# Altium footprint library Connectors.PcbLib: 135 footprints (part 1 of 9)
Each footprint in its own frame and in the unit in brackets; x right, y up, seen from the top. Pads: shape width x height; smd on the part's side, far side on the other; paste and mask are expansions set on the pad; w line width, h text height; cw(c..) or ccw(c..) is an arc to the next point about the centre after c.
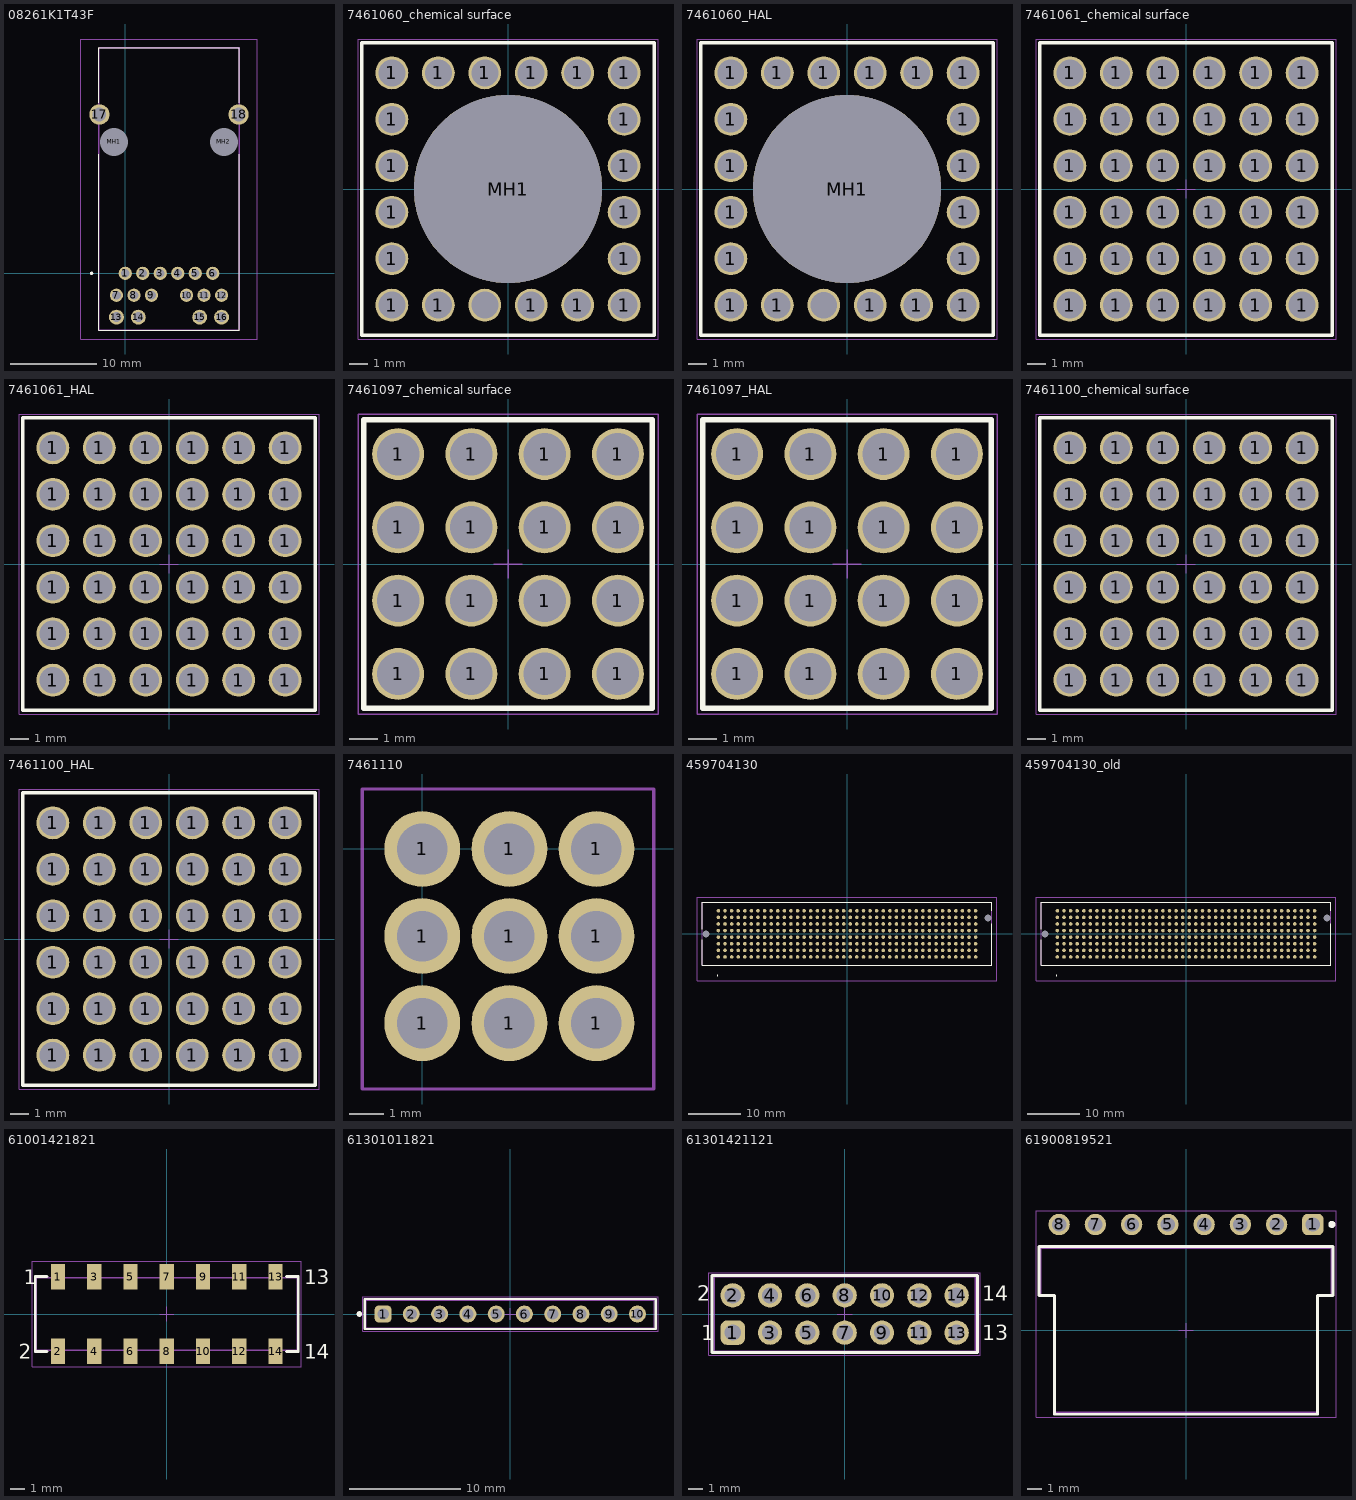
[diagram p0: the footprints below, top view; thin cyan lines are the x and y axes]

## 08261K1T43F [mm]
pads (20):
  round 1.53 hole 1.02: 1(0,0) 2(2.03,0) 3(4.06,0) 4(6.09,0) 5(8.12,0) 6(10.15,0) 7(-1.015,-2.54) 8(1.015,-2.54) 9(3.045,-2.54) 10(7.105,-2.54) 11(9.135,-2.54) 12(11.165,-2.54)
  round 1.725 hole 1.15: 13(-1.02,-5.08) 14(1.52,-5.08) 15(8.63,-5.08) 16(11.17,-5.08)
  round 2.355 hole 1.57: 17(-2.99,18.41) 18(13.14,18.41)
  round 1.625 hole 3.25 unplated: MH1(-1.275,15.24) MH2(11.425,15.24)
Top Overlay:
  lines w0.1: -3.08,13.78 -3.08,-6.61 13.075,-6.61 13.23,-6.61 13.23,13.78 ; -3.08,19.78 -3.08,26.16 13.23,26.16 13.23,19.78
  lines w0.2: -3.9,-0.1 ccw(c-3.9,0) -3.9,0.1 ccw(c-3.9,0) -3.9,-0.1
Top Component Outline:
  lines w0.2: -3.08,-6.61 13.23,-6.61 13.23,26.16 -3.08,26.16 -3.08,-6.61
Top Courtyard (Mech26):
  lines w0.1: -5.168,-7.61 15.317,-7.61 15.317,27.16 -5.168,27.16 -5.168,-7.61
3D body "0826-1K1T-43-F.stp": height 13.71, standoff -5, extent -3.675,-6.61 13.825,26.16

## 7461060_chemical surface [mm] "M10, thr 17.5mm"
height 17.5
pads (21):
  round 1.8 hole 1.475: 1(-6.35,-6.35) 1(-6.35,-3.81) 1(-6.35,-1.27) 1(-6.35,1.27) 1(-6.35,3.81) 1(-6.35,6.35) 1(-3.81,-6.35) 1(-3.81,6.35) 1(-1.27,6.35) 1(1.27,-6.35) 1(1.27,6.35) 1(3.81,-6.35) 1(3.81,6.35) 1(6.35,-6.35) 1(6.35,-3.81) 1(6.35,-1.27) 1(6.35,1.27) 1(6.35,3.81) 1(6.35,6.35) ""(-1.27,-6.35)
  round 10.3 hole 10.3 unplated: MH1(0,0)
Top Overlay:
  lines w0.2: -8,-8 8,-8 8,8 -8,8 -8,-8
Top 3D Body (Mech20):
  lines w0.1: -8,-8 8,-8 8,8 -8,8 -8,-8
Top Component Outline:
  lines w0.1: -8,-8 -8,8 8,8 8,-8 -8,-8
Top Courtyard (Mech26):
  lines w0.05: -0.5,0 0.5,0 ; 0,-0.5 0,0.5 ; -8.2,-8.2 -8.2,8.2 8.2,8.2 8.2,-8.2 -8.2,-8.2
Top Designator:
  text ".Designator" at -7.498,-0.5 h1.5
3D body "7461060.stp": height 17.5, standoff -3.5, extent -8,-8 8,8

## 7461060_HAL [mm] "M10, thr 17.5mm"
height 17.5
pads (21):
  round 1.8 hole 1.45: 1(-6.35,-6.35) 1(-6.35,-3.81) 1(-6.35,-1.27) 1(-6.35,1.27) 1(-6.35,3.81) 1(-6.35,6.35) 1(-3.81,-6.35) 1(-3.81,6.35) 1(-1.27,6.35) 1(1.27,-6.35) 1(1.27,6.35) 1(3.81,-6.35) 1(3.81,6.35) 1(6.35,-6.35) 1(6.35,-3.81) 1(6.35,-1.27) 1(6.35,1.27) 1(6.35,3.81) 1(6.35,6.35) ""(-1.27,-6.35)
  round 10.3 hole 10.3 unplated: MH1(0,0)
Top Overlay:
  lines w0.2: -8,-8 8,-8 8,8 -8,8 -8,-8
Top 3D Body (Mech20):
  lines w0.1: -8,-8 -8,8 8,8 8,-8 -8,-8
Top Component Outline:
  lines w0.1: -8,-8 8,-8 8,8 -8,8 -8,-8
Top Courtyard (Mech26):
  lines w0.05: -0.5,0 0.5,0 ; 0,-0.5 0,0.5 ; -8.2,-8.2 -8.2,8.2 8.2,8.2 8.2,-8.2 -8.2,-8.2
Top Designator:
  text ".Designator" at -7.498,-0.5 h1.5
3D body "7461060.stp": height 17.5, standoff -3.5, extent -8,-8 8,8

## 7461061_chemical surface [mm] "M10, blind 11mm"
height 17.5
pads (36):
  round 1.8 hole 1.475: 1(-6.35,-6.35) 1(-6.35,-3.81) 1(-6.35,-1.27) 1(-6.35,1.27) 1(-6.35,3.81) 1(-6.35,6.35) 1(-3.81,-6.35) 1(-3.81,-3.81) 1(-3.81,-1.27) 1(-3.81,1.27) 1(-3.81,3.81) 1(-3.81,6.35) 1(-1.27,-6.35) 1(-1.27,-3.81) 1(-1.27,-1.27) 1(-1.27,1.27) 1(-1.27,3.81) 1(-1.27,6.35) 1(1.27,-6.35) 1(1.27,-3.81) 1(1.27,-1.27) 1(1.27,1.27) 1(1.27,3.81) 1(1.27,6.35) 1(3.81,-6.35) 1(3.81,-3.81) 1(3.81,-1.27) 1(3.81,1.27) 1(3.81,3.81) 1(3.81,6.35) 1(6.35,-6.35) 1(6.35,-3.81) 1(6.35,-1.27) 1(6.35,1.27) 1(6.35,3.81) 1(6.35,6.35)
Top Overlay:
  lines w0.2: -8,-8 -8,8 8,8 8,-8 -8,-8
Top 3D Body (Mech20):
  lines w0.1: -8,-8 -8,8 8,8 8,-8 -8,-8
Top Component Outline:
  lines w0.1: -8,-8 8,-8 8,8 -8,8 -8,-8
Top Courtyard (Mech26):
  lines w0.05: -0.5,0 0.5,0 ; 0,-0.5 0,0.5 ; -8.2,-8.2 -8.2,8.2 8.2,8.2 8.2,-8.2 -8.2,-8.2
Top Designator:
  text ".Designator" at -7.498,-0.5 h1.5
3D body "7461061.stp": height 17.5, standoff -3.5, extent -8,-8 8,8

## 7461061_HAL [mm] "M10, blind 11mm"
height 17.5
pads (36):
  round 1.8 hole 1.45: 1(-6.35,-6.35) 1(-6.35,-3.81) 1(-6.35,-1.27) 1(-6.35,1.27) 1(-6.35,3.81) 1(-6.35,6.35) 1(-3.81,-6.35) 1(-3.81,-3.81) 1(-3.81,-1.27) 1(-3.81,1.27) 1(-3.81,3.81) 1(-3.81,6.35) 1(-1.27,-6.35) 1(-1.27,-3.81) 1(-1.27,-1.27) 1(-1.27,1.27) 1(-1.27,3.81) 1(-1.27,6.35) 1(1.27,-6.35) 1(1.27,-3.81) 1(1.27,-1.27) 1(1.27,1.27) 1(1.27,3.81) 1(1.27,6.35) 1(3.81,-6.35) 1(3.81,-3.81) 1(3.81,-1.27) 1(3.81,1.27) 1(3.81,3.81) 1(3.81,6.35) 1(6.35,-6.35) 1(6.35,-3.81) 1(6.35,-1.27) 1(6.35,1.27) 1(6.35,3.81) 1(6.35,6.35)
Top Overlay:
  lines w0.2: -8,-8 8,-8 8,8 -8,8 -8,-8
Top 3D Body (Mech20):
  lines w0.1: -8,-8 -8,8 8,8 8,-8 -8,-8
Top Component Outline:
  lines w0.1: -8,-8 8,-8 8,8 -8,8 -8,-8
Top Courtyard (Mech26):
  lines w0.05: -0.5,0 0.5,0 ; 0,-0.5 0,0.5 ; -8.2,-8.2 8.2,-8.2 8.2,8.2 -8.2,8.2 -8.2,-8.2
Top Designator:
  text ".Designator" at -7.498,-0.5 h1.5
3D body "7461061.stp": height 17.5, standoff -3.5, extent -8,-8 8,8

## 7461097_chemical surface [mm] "M6, blind 6.5mm"
height 10.5
pads (16):
  round 1.8 hole 1.475: 1(-3.81,-3.81) 1(-3.81,-1.27) 1(-3.81,1.27) 1(-3.81,3.81) 1(-1.27,-3.81) 1(-1.27,-1.27) 1(-1.27,1.27) 1(-1.27,3.81) 1(1.27,-3.81) 1(1.27,-1.27) 1(1.27,1.27) 1(1.27,3.81) 1(3.81,-3.81) 1(3.81,-1.27) 1(3.81,1.27) 1(3.81,3.81)
Top Overlay:
  lines w0.2: -5,-5 5,-5 5,5 -5,5 -5,-5
Top 3D Body (Mech20):
  lines w0.1: -5,-5 5,-5 5,5 -5,5 -5,-5
Top Component Outline:
  lines w0.1: -5,-5 -5,5 5,5 5,-5 -5,-5
Top Courtyard (Mech26):
  lines w0.05: -0.5,0 0.5,0 ; 0,-0.5 0,0.5 ; -5.2,-5.2 -5.2,5.2 5.2,5.2 5.2,-5.2 -5.2,-5.2
Top Designator:
  text ".Designator" at -7.498,-0.5 h1.5
3D body "7461097.stp": height 10.5, standoff -3.5, extent -5,-5 5,5

## 7461097_HAL [mm] "M6, blind 6.5mm"
height 10.5
pads (16):
  round 1.8 hole 1.45: 1(-3.81,-3.81) 1(-3.81,-1.27) 1(-3.81,1.27) 1(-3.81,3.81) 1(-1.27,-3.81) 1(-1.27,-1.27) 1(-1.27,1.27) 1(-1.27,3.81) 1(1.27,-3.81) 1(1.27,-1.27) 1(1.27,1.27) 1(1.27,3.81) 1(3.81,-3.81) 1(3.81,-1.27) 1(3.81,1.27) 1(3.81,3.81)
Top Overlay:
  lines w0.2: -5,-5 -5,5 5,5 5,-5 -5,-5
Top 3D Body (Mech20):
  lines w0.1: -5,-5 5,-5 5,5 -5,5 -5,-5
Top Component Outline:
  lines w0.1: -5,-5 5,-5 5,5 -5,5 -5,-5
Top Courtyard (Mech26):
  lines w0.05: -0.5,0 0.5,0 ; 0,-0.5 0,0.5 ; -5.2,-5.2 5.2,-5.2 5.2,5.2 -5.2,5.2 -5.2,-5.2
Top Designator:
  text ".Designator" at -7.498,-0.5 h1.5
3D body "7461097.stp": height 10.5, standoff -3.5, extent -5,-5 5,5

## 7461100_chemical surface [mm] "M10, thread 16mm"
height 24
pads (36):
  round 1.8 hole 1.475: 1(-6.35,-6.35) 1(-6.35,-3.81) 1(-6.35,-1.27) 1(-6.35,1.27) 1(-6.35,3.81) 1(-6.35,6.35) 1(-3.81,-6.35) 1(-3.81,-3.81) 1(-3.81,-1.27) 1(-3.81,1.27) 1(-3.81,3.81) 1(-3.81,6.35) 1(-1.27,-6.35) 1(-1.27,-3.81) 1(-1.27,-1.27) 1(-1.27,1.27) 1(-1.27,3.81) 1(-1.27,6.35) 1(1.27,-6.35) 1(1.27,-3.81) 1(1.27,-1.27) 1(1.27,1.27) 1(1.27,3.81) 1(1.27,6.35) 1(3.81,-6.35) 1(3.81,-3.81) 1(3.81,-1.27) 1(3.81,1.27) 1(3.81,3.81) 1(3.81,6.35) 1(6.35,-6.35) 1(6.35,-3.81) 1(6.35,-1.27) 1(6.35,1.27) 1(6.35,3.81) 1(6.35,6.35)
Top Overlay:
  lines w0.2: -8,-8 -8,8 8,8 8,-8 -8,-8
Top 3D Body (Mech20):
  lines w0.1: -8,-8 -8,8 8,8 8,-8 -8,-8
Top Component Outline:
  lines w0.1: -8,-8 8,-8 8,8 -8,8 -8,-8
Top Courtyard (Mech26):
  lines w0.05: -0.5,0 0.5,0 ; 0,-0.5 0,0.5 ; -8.2,-8.2 -8.2,8.2 8.2,8.2 8.2,-8.2 -8.2,-8.2
Top Designator:
  text ".Designator" at -7.498,-0.5 h1.5
3D body "7461100.stp": height 24, standoff -3.5, extent -8,-8 8,8

## 7461100_HAL [mm] "M10, thread 16mm"
height 24
pads (36):
  round 1.8 hole 1.45: 1(-6.35,-6.35) 1(-6.35,-3.81) 1(-6.35,-1.27) 1(-6.35,1.27) 1(-6.35,3.81) 1(-6.35,6.35) 1(-3.81,-6.35) 1(-3.81,-3.81) 1(-3.81,-1.27) 1(-3.81,1.27) 1(-3.81,3.81) 1(-3.81,6.35) 1(-1.27,-6.35) 1(-1.27,-3.81) 1(-1.27,-1.27) 1(-1.27,1.27) 1(-1.27,3.81) 1(-1.27,6.35) 1(1.27,-6.35) 1(1.27,-3.81) 1(1.27,-1.27) 1(1.27,1.27) 1(1.27,3.81) 1(1.27,6.35) 1(3.81,-6.35) 1(3.81,-3.81) 1(3.81,-1.27) 1(3.81,1.27) 1(3.81,3.81) 1(3.81,6.35) 1(6.35,-6.35) 1(6.35,-3.81) 1(6.35,-1.27) 1(6.35,1.27) 1(6.35,3.81) 1(6.35,6.35)
Top Overlay:
  lines w0.2: -8,-8 -8,8 8,8 8,-8 -8,-8
Top 3D Body (Mech20):
  lines w0.1: -8,-8 8,-8 8,8 -8,8 -8,-8
Top Component Outline:
  lines w0.1: -8,-8 -8,8 8,8 8,-8 -8,-8
Top Courtyard (Mech26):
  lines w0.05: -0.5,0 0.5,0 ; 0,-0.5 0,0.5 ; -8.2,-8.2 -8.2,8.2 8.2,8.2 8.2,-8.2 -8.2,-8.2
Top Designator:
  text ".Designator" at -7.498,-0.5 h1.5
3D body "7461100.stp": height 24, standoff -3.5, extent -8,-8 8,8

## 7461110 [mm]
pads (9):
  round 2.213 hole 1.475: 1(0,-5.08) 1(0,-2.54) 1(0,0) 1(2.54,-5.08) 1(2.54,-2.54) 1(2.54,0) 1(5.08,-5.08) 1(5.08,-2.54) 1(5.08,0)
Top Courtyard (Mech26):
  lines w0.1: -1.75,-7 6.75,-7 6.75,1.75 -1.75,1.75 -1.75,-7
3D body "7461110 (rev1).stp": height 14, standoff -3.5, extent -0.96,-6.04 6.04,0.96

## 459704130 [mil]
pads (322):
  round 27.01 smd: 1(-975,-175) 2(-975,-125) 3(-975,-75) 4(-975,-25) 5(-975,25) 6(-975,75) 7(-975,125) 8(-975,175) 9(-925,-175) 10(-925,-125) 11(-925,-75) 12(-925,-25) 13(-925,25) 14(-925,75) 15(-925,125) 16(-925,175) 17(-875,-175) 18(-875,-125) 19(-875,-75) 20(-875,-25) 21(-875,25) 22(-875,75) 23(-875,125) 24(-875,175) 25(-825,-175) 26(-825,-125) 27(-825,-75) 28(-825,-25) 29(-825,25) 30(-825,75) 31(-825,125) 32(-825,175) 33(-775,-175) 34(-775,-125) 35(-775,-75) 36(-775,-25) 37(-775,25) 38(-775,75) 39(-775,125) 40(-775,175) 41(-725,-175) 42(-725,-125) 43(-725,-75) 44(-725,-25) 45(-725,25) 46(-725,75) 47(-725,125) 48(-725,175) 49(-675,-175) 50(-675,-125) 51(-675,-75) 52(-675,-25) 53(-675,25) 54(-675,75) 55(-675,125) 56(-675,175) 57(-625,-175) 58(-625,-125) 59(-625,-75) 60(-625,-25) 61(-625,25) 62(-625,75) 63(-625,125) 64(-625,175) 65(-575,-175) 66(-575,-125) 67(-575,-75) 68(-575,-25) 69(-575,25) 70(-575,75) 71(-575,125) 72(-575,175) 73(-525,-175) 74(-525,-125) 75(-525,-75) 76(-525,-25) 77(-525,25) 78(-525,75) 79(-525,125) 80(-525,175) 81(-475,-175) 82(-475,-125) 83(-475,-75) 84(-475,-25) 85(-475,25) 86(-475,75) 87(-475,125) 88(-475,175) 89(-425,-175) 90(-425,-125) 91(-425,-75) 92(-425,-25) 93(-425,25) 94(-425,75) 95(-425,125) 96(-425,175) 97(-375,-175) 98(-375,-125) 99(-375,-75) 100(-375,-25) 101(-375,25) 102(-375,75) 103(-375,125) 104(-375,175) 105(-325,-175) 106(-325,-125) 107(-325,-75) 108(-325,-25) 109(-325,25) 110(-325,75) 111(-325,125) 112(-325,175) 113(-275,-175) 114(-275,-125) 115(-275,-75) 116(-275,-25) 117(-275,25) 118(-275,75) 119(-275,125) 120(-275,175) 121(-225,-175) 122(-225,-125) 123(-225,-75) 124(-225,-25) 125(-225,25) 126(-225,75) 127(-225,125) 128(-225,175) 129(-175,-175) 130(-175,-125) 131(-175,-75) 132(-175,-25) 133(-175,25) 134(-175,75) 135(-175,125) 136(-175,175) 137(-125,-175) 138(-125,-125) 139(-125,-75) 140(-125,-25) 141(-125,25) 142(-125,75) 143(-125,125) 144(-125,175) 145(-75,-175) 146(-75,-125) 147(-75,-75) 148(-75,-25) 149(-75,25) 150(-75,75) 151(-75,125) 152(-75,175) 153(-25,-175) 154(-25,-125) 155(-25,-75) 156(-25,-25) 157(-25,25) 158(-25,75) 159(-25,125) 160(-25,175) 161(25,-175) 162(25,-125) 163(25,-75) 164(25,-25) 165(25,25) 166(25,75) 167(25,125) 168(25,175) 169(75,-175) 170(75,-125) 171(75,-75) 172(75,-25) 173(75,25) 174(75,75) 175(75,125) 176(75,175) 177(125,-175) 178(125,-125) 179(125,-75) 180(125,-25) 181(125,25) 182(125,75) 183(125,125) 184(125,175) 185(175,-175) 186(175,-125) 187(175,-75) 188(175,-25) 189(175,25) 190(175,75) 191(175,125) 192(175,175) 193(225,-175) 194(225,-125) 195(225,-75) 196(225,-25) 197(225,25) 198(225,75) 199(225,125) 200(225,175) 201(275,-175) 202(275,-125) 203(275,-75) 204(275,-25) 205(275,25) 206(275,75) 207(275,125) 208(275,175) 209(325,-175) 210(325,-125) 211(325,-75) 212(325,-25) 213(325,25) 214(325,75) 215(325,125) 216(325,175) 217(375,-175) 218(375,-125) 219(375,-75) 220(375,-25) 221(375,25) 222(375,75) 223(375,125) 224(375,175) 225(425,-175) 226(425,-125) 227(425,-75) 228(425,-25) 229(425,25) 230(425,75) 231(425,125) 232(425,175) 233(475,-175) 234(475,-125) 235(475,-75) 236(475,-25) 237(475,25) 238(475,75) 239(475,125) 240(475,175) 241(525,-175) 242(525,-125) 243(525,-75) 244(525,-25) 245(525,25) 246(525,75) 247(525,125) 248(525,175) 249(575,-175) 250(575,-125) 251(575,-75) 252(575,-25) 253(575,25) 254(575,75) 255(575,125) 256(575,175) 257(625,-175) 258(625,-125) 259(625,-75) 260(625,-25) 261(625,25) 262(625,75) 263(625,125) 264(625,175) 265(675,-175) 266(675,-125) 267(675,-75) 268(675,-25) 269(675,25) 270(675,75) 271(675,125) 272(675,175) 273(725,-175) 274(725,-125) 275(725,-75) 276(725,-25) 277(725,25) 278(725,75) 279(725,125) 280(725,175) 281(775,-175) 282(775,-125) 283(775,-75) 284(775,-25) 285(775,25) 286(775,75) 287(775,125) 288(775,175) 289(825,-175) 290(825,-125) 291(825,-75) 292(825,-25) 293(825,25) 294(825,75) 295(825,125) 296(825,175) 297(875,-175) 298(875,-125) 299(875,-75) 300(875,-25) 301(875,25) 302(875,75) 303(875,125) 304(875,175) 305(925,-175) 306(925,-125) 307(925,-75) 308(925,-25) 309(925,25) 310(925,75) 311(925,125) 312(925,175) 313(975,-175) 314(975,-125) 315(975,-75) 316(975,-25) 317(975,25) 318(975,75) 319(975,125) 320(975,175)
  round 26.5 hole 53 unplated: MH1(-1070.51,0) MH2(1070.51,120)
Top Overlay:
  lines w3.94: -1097.99,-239.02 -1097.99,-43.11 -1097.99,-239.02 ; -1097.99,-239.02 1097.99,-239.02 ; -1097.99,-239.02 1097.99,-239.02 ; -1097.99,239.02 1097.99,239.02 ; -1097.99,239.02 1097.99,239.02 ; -1097.99,239.02 -1097.99,35.63 -1097.99,239.02 ; 1097.99,-239.02 1097.99,75 1097.99,-239.02 ; 1097.99,239.02 1097.99,173.43 1097.99,239.02
  lines w7.87: -984.25,-314.96 ccw(c-982.28,-314.96) -980.32,-314.96 ; -984.25,-314.96 cw(c-982.28,-314.96) -980.32,-314.96 ; -984.25,-314.96 ccw(c-982.28,-314.96) -980.32,-314.96
Top Component Outline:
  lines w7.87: -1097.99,-239.02 -1097.99,239.02 1097.99,239.02 1097.99,-239.02 -1097.99,-239.02
Top Courtyard (Mech26):
  lines w3.94: -1137.36,-356.3 1137.36,-356.3 1137.36,278.39 -1137.36,278.39 -1137.36,-356.3
3D body "45970-4130.stp": height 228.94, standoff -66.93, extent -1097.99,-239.02 1097.99,239.02

## 459704130_old [mil]
pads (322):
  round 27.01 smd: A1(-975,-175) A2(-925,-175) A3(-875,-175) A4(-825,-175) A5(-775,-175) A6(-725,-175) A7(-675,-175) A8(-625,-175) A9(-575,-175) A10(-525,-175) A11(-475,-175) A12(-425,-175) A13(-375,-175) A14(-325,-175) A15(-275,-175) A16(-225,-175) A17(-175,-175) A18(-125,-175) A19(-75,-175) A20(-25,-175) A21(25,-175) A22(75,-175) A23(125,-175) A24(175,-175) A25(225,-175) A26(275,-175) A27(325,-175) A28(375,-175) A29(425,-175) A30(475,-175) A31(525,-175) A32(575,-175) A33(625,-175) A34(675,-175) A35(725,-175) A36(775,-175) A37(825,-175) A38(875,-175) A39(925,-175) A40(975,-175) B1(-975,-125) B2(-925,-125) B3(-875,-125) B4(-825,-125) B5(-775,-125) B6(-725,-125) B7(-675,-125) B8(-625,-125) B9(-575,-125) B10(-525,-125) B11(-475,-125) B12(-425,-125) B13(-375,-125) B14(-325,-125) B15(-275,-125) B16(-225,-125) B17(-175,-125) B18(-125,-125) B19(-75,-125) B20(-25,-125) B21(25,-125) B22(75,-125) B23(125,-125) B24(175,-125) B25(225,-125) B26(275,-125) B27(325,-125) B28(375,-125) B29(425,-125) B30(475,-125) B31(525,-125) B32(575,-125) B33(625,-125) B34(675,-125) B35(725,-125) B36(775,-125) B37(825,-125) B38(875,-125) B39(925,-125) B40(975,-125) C1(-975,-75) C2(-925,-75) C3(-875,-75) C4(-825,-75) C5(-775,-75) C6(-725,-75) C7(-675,-75) C8(-625,-75) C9(-575,-75) C10(-525,-75) C11(-475,-75) C12(-425,-75) C13(-375,-75) C14(-325,-75) C15(-275,-75) C16(-225,-75) C17(-175,-75) C18(-125,-75) C19(-75,-75) C20(-25,-75) C21(25,-75) C22(75,-75) C23(125,-75) C24(175,-75) C25(225,-75) C26(275,-75) C27(325,-75) C28(375,-75) C29(425,-75) C30(475,-75) C31(525,-75) C32(575,-75) C33(625,-75) C34(675,-75) C35(725,-75) C36(775,-75) C37(825,-75) C38(875,-75) C39(925,-75) C40(975,-75) D1(-975,-25) D2(-925,-25) D3(-875,-25) D4(-825,-25) D5(-775,-25) D6(-725,-25) D7(-675,-25) D8(-625,-25) D9(-575,-25) D10(-525,-25) D11(-475,-25) D12(-425,-25) D13(-375,-25) D14(-325,-25) D15(-275,-25) D16(-225,-25) D17(-175,-25) D18(-125,-25) D19(-75,-25) D20(-25,-25) D21(25,-25) D22(75,-25) D23(125,-25) D24(175,-25) D25(225,-25) D26(275,-25) D27(325,-25) D28(375,-25) D29(425,-25) D30(475,-25) D31(525,-25) D32(575,-25) D33(625,-25) D34(675,-25) D35(725,-25) D36(775,-25) D37(825,-25) D38(875,-25) D39(925,-25) D40(975,-25) E1(-975,25) E2(-925,25) E3(-875,25) E4(-825,25) E5(-775,25) E6(-725,25) E7(-675,25) E8(-625,25) E9(-575,25) E10(-525,25) E11(-475,25) E12(-425,25) E13(-375,25) E14(-325,25) E15(-275,25) E16(-225,25) E17(-175,25) E18(-125,25) E19(-75,25) E20(-25,25) E21(25,25) E22(75,25) E23(125,25) E24(175,25) E25(225,25) E26(275,25) E27(325,25) E28(375,25) E29(425,25) E30(475,25) E31(525,25) E32(575,25) E33(625,25) E34(675,25) E35(725,25) E36(775,25) E37(825,25) E38(875,25) E39(925,25) E40(975,25) F1(-975,75) F2(-925,75) F3(-875,75) F4(-825,75) F5(-775,75) F6(-725,75) F7(-675,75) F8(-625,75) F9(-575,75) F10(-525,75) F11(-475,75) F12(-425,75) F13(-375,75) F14(-325,75) F15(-275,75) F16(-225,75) F17(-175,75) F18(-125,75) F19(-75,75) F20(-25,75) F21(25,75) F22(75,75) F23(125,75) F24(175,75) F25(225,75) F26(275,75) F27(325,75) F28(375,75) F29(425,75) F30(475,75) F31(525,75) F32(575,75) F33(625,75) F34(675,75) F35(725,75) F36(775,75) F37(825,75) F38(875,75) F39(925,75) F40(975,75) G1(-975,125) G2(-925,125) G3(-875,125) G4(-825,125) G5(-775,125) G6(-725,125) G7(-675,125) G8(-625,125) G9(-575,125) G10(-525,125) G11(-475,125) G12(-425,125) G13(-375,125) G14(-325,125) G15(-275,125) G16(-225,125) G17(-175,125) G18(-125,125) G19(-75,125) G20(-25,125) G21(25,125) G22(75,125) G23(125,125) G24(175,125) G25(225,125) G26(275,125) G27(325,125) G28(375,125) G29(425,125) G30(475,125) G31(525,125) G32(575,125) G33(625,125) G34(675,125) G35(725,125) G36(775,125) G37(825,125) G38(875,125) G39(925,125) G40(975,125) H1(-975,175) H2(-925,175) H3(-875,175) H4(-825,175) H5(-775,175) H6(-725,175) H7(-675,175) H8(-625,175) H9(-575,175) H10(-525,175) H11(-475,175) H12(-425,175) H13(-375,175) H14(-325,175) H15(-275,175) H16(-225,175) H17(-175,175) H18(-125,175) H19(-75,175) H20(-25,175) H21(25,175) H22(75,175) H23(125,175) H24(175,175) H25(225,175) H26(275,175) H27(325,175) H28(375,175) H29(425,175) H30(475,175) H31(525,175) H32(575,175) H33(625,175) H34(675,175) H35(725,175) H36(775,175) H37(825,175) H38(875,175) H39(925,175) H40(975,175)
  round 26.5 hole 53 unplated: MH1(-1070.51,0) MH2(1070.51,120)
Top Overlay:
  lines w3.94: -1097.99,-239.02 -1097.99,-43.11 -1097.99,-239.02 ; -1097.99,-239.02 1097.99,-239.02 ; -1097.99,-239.02 1097.99,-239.02 ; -1097.99,239.02 1097.99,239.02 ; -1097.99,239.02 1097.99,239.02 ; -1097.99,239.02 -1097.99,35.63 -1097.99,239.02 ; 1097.99,-239.02 1097.99,75 1097.99,-239.02 ; 1097.99,239.02 1097.99,173.43 1097.99,239.02
  lines w7.87: -984.25,-314.96 ccw(c-982.28,-314.96) -980.32,-314.96 ; -984.25,-314.96 cw(c-982.28,-314.96) -980.32,-314.96 ; -984.25,-314.96 ccw(c-982.28,-314.96) -980.32,-314.96
Top Component Outline:
  lines w7.87: -1097.99,-239.02 1097.99,-239.02 1097.99,239.02 -1097.99,239.02 -1097.99,-239.02
Top Courtyard (Mech26):
  lines w3.94: -1137.36,-356.3 -1137.36,278.39 1137.36,278.39 1137.36,-356.3 -1137.36,-356.3
3D body "45970-4130.stp": height 228.94, standoff -66.93, extent -1097.99,-239.02 1097.99,239.02

## 61001421821 [mm] "Socket Header, Pitch 2.54 mm, SMT, Vertical, dual row, 14p"
height 7.45
pads (14):
  rect 1x1.8 smd: 1(-7.62,2.6) 2(-7.62,-2.6) 3(-5.08,2.6) 4(-5.08,-2.6) 5(-2.54,2.6) 6(-2.54,-2.6) 7(0,2.6) 8(0,-2.6) 9(2.54,2.6) 10(2.54,-2.6) 11(5.08,2.6) 12(5.08,-2.6) 13(7.62,2.6) 14(7.62,-2.6)
Top Overlay:
  lines w0.2: -8.4,-2.615 -9.215,-2.615 -9.215,2.615 -8.4,2.615 ; 8.4,-2.615 9.215,-2.615 9.215,2.615 8.4,2.615
  text "14" at 9.65,-3.15 h1.02
  text "13" at 9.65,2.1 h1.02
  text "2" at -10.35,-3.15 h1.02
  text "1" at -10,2.1 h1.02
Top 3D Body (Mech20):
  lines w0.1: -7.94,-2.54 -7.94,-3.35 -7.3,-3.35 -7.3,-2.54 ; -7.94,2.54 -7.94,3.35 -7.3,3.35 -7.3,2.54 ; -5.4,-2.54 -5.4,-3.35 -4.76,-3.35 -4.76,-2.54 ; -5.4,2.54 -5.4,3.35 -4.76,3.35 -4.76,2.54 ; -2.86,-2.54 -2.86,-3.35 -2.22,-3.35 -2.22,-2.54 ; -2.86,2.54 -2.86,3.35 -2.22,3.35 -2.22,2.54 ; -0.32,-2.54 -0.32,-3.35 0.32,-3.35 0.32,-2.54 ; -0.32,2.54 -0.32,3.35 0.32,3.35 0.32,2.54 ; 2.22,-2.54 2.22,-3.35 2.86,-3.35 2.86,-2.54 ; 2.22,2.54 2.22,3.35 2.86,3.35 2.86,2.54 ; 4.76,-2.54 4.76,-3.35 5.4,-3.35 5.4,-2.54 ; 4.76,2.54 4.76,3.35 5.4,3.35 5.4,2.54 ; 7.3,-2.54 7.3,-3.35 7.94,-3.35 7.94,-2.54 ; 7.3,2.54 7.3,3.35 7.94,3.35 7.94,2.54 ; -9.14,-2.54 9.14,-2.54 9.14,2.54 -9.14,2.54 -9.14,-2.54
Top Component Outline:
  lines w0.1: -7.94,-2.54 -7.94,-3.35 -7.3,-3.35 -7.3,-2.54 ; -7.94,2.54 -7.94,3.35 -7.3,3.35 -7.3,2.54 ; -5.4,-2.54 -5.4,-3.35 -4.76,-3.35 -4.76,-2.54 ; -5.4,2.54 -5.4,3.35 -4.76,3.35 -4.76,2.54 ; -2.86,-2.54 -2.86,-3.35 -2.22,-3.35 -2.22,-2.54 ; -2.86,2.54 -2.86,3.35 -2.22,3.35 -2.22,2.54 ; -0.32,-2.54 -0.32,-3.35 0.32,-3.35 0.32,-2.54 ; -0.32,2.54 -0.32,3.35 0.32,3.35 0.32,2.54 ; 2.22,-2.54 2.22,-3.35 2.86,-3.35 2.86,-2.54 ; 2.22,2.54 2.22,3.35 2.86,3.35 2.86,2.54 ; 4.76,-2.54 4.76,-3.35 5.4,-3.35 5.4,-2.54 ; 4.76,2.54 4.76,3.35 5.4,3.35 5.4,2.54 ; 7.3,-2.54 7.3,-3.35 7.94,-3.35 7.94,-2.54 ; 7.3,2.54 7.3,3.35 7.94,3.35 7.94,2.54 ; -9.14,-2.54 -9.14,2.54 9.14,2.54 9.14,-2.54 -9.14,-2.54
Top Courtyard (Mech26):
  lines w0.05: -0.5,0 0.5,0 ; 0,-0.5 0,0.5 ; -9.415,-3.7 9.415,-3.7 9.415,3.7 -9.415,3.7 -9.415,-3.7
Top Designator:
  text ".Designator" at -7.498,-0.5 h1.5
3D body "61001421821.stp": height 8.5, standoff 0, extent -8.89,-3.35 8.89,3.35

## 61301011821 [mm] "Socket Header, Pitch 2.54 mm, THT, Vertical, single row, 10p"
height 8.5
pads (10):
  rrect50% 1.52x1.52 hole 1.02: 1(-11.43,0)
  round 1.52 hole 1.02: 2(-8.89,0) 3(-6.35,0) 4(-3.81,0) 5(-1.27,0) 6(1.27,0) 7(3.81,0) 8(6.35,0) 9(8.89,0) 10(11.43,0)
Top Overlay:
  circle w0.25: c-13.56,0 r0.125
  lines w0.2: -13.075,-1.35 -13.075,1.35 13.075,1.35 13.075,-1.35 -13.075,-1.35
Top Component Center:
  lines w0.05: -0.5,0 0.5,0 ; 0,-0.5 0,0.5
Top Component Outline:
  lines w0.1: -12.95,-1.25 -12.95,1.25 12.95,1.25 12.95,-1.25 -12.95,-1.25
Top Courtyard (Mech26):
  lines w0.05: -13.275,-1.55 -13.275,1.55 13.275,1.55 13.275,-1.55 -13.275,-1.55
Top Designator:
  text ".Designator" at -7.498,-0.5 h1.5
3D body "61301011821.stp": height 8.55, standoff -3.06, extent -12.95,-1.25 12.95,1.25

## 61301421121 [mm] "Pin Header, pitch 2.54 mm, THT, Vertical, dual row, 14p"
height 8.54
pads (14):
  rrect50% 1.65x1.65 hole 1.1: 1(-7.62,-1.27)
  round 1.65 hole 1.1: 2(-7.62,1.27) 3(-5.08,-1.27) 4(-5.08,1.27) 5(-2.54,-1.27) 6(-2.54,1.27) 7(0,-1.27) 8(0,1.27) 9(2.54,-1.27) 10(2.54,1.27) 11(5.08,-1.27) 12(5.08,1.27) 13(7.62,-1.27) 14(7.62,1.27)
Top Overlay:
  lines w0.2: -9.04,-2.615 9.04,-2.615 9.04,2.615 -9.04,2.615 -9.04,-2.615
  text "14" at 9.35,0.9 h1.02
  text "13" at 9.35,-1.8 h1.02
  text "2" at -10.05,0.9 h1.02
  text "1" at -9.75,-1.8 h1.02
Top 3D Body (Mech20):
  lines w0.1: -8.89,-2.54 8.89,-2.54 8.89,2.54 -8.89,2.54 -8.89,-2.54
Top Component Outline:
  lines w0.1: -8.89,-2.54 8.89,-2.54 8.89,2.54 -8.89,2.54 -8.89,-2.54
Top Courtyard (Mech26):
  lines w0.05: -0.5,0 0.5,0 ; 0,-0.5 0,0.5 ; -9.24,-2.815 -9.24,2.815 9.24,2.815 9.24,-2.815 -9.24,-2.815
Top Designator:
  text ".Designator" at -7.498,-0.5 h1.5
3D body "61301421121.stp": height 8.59, standoff -2.95, extent -8.89,-2.54 8.89,2.54

## 61900819521 [mm] "2.54mm Male Right Angled Locking Header Top Locking, 8p"
height 5.8
pads (8):
  rrect50% 1.5x1.5 hole 1: 1(8.89,7.42)
  round 1.5 hole 1: 2(6.35,7.42) 3(3.81,7.42) 4(1.27,7.42) 5(-1.27,7.42) 6(-3.81,7.42) 7(-6.35,7.42) 8(-8.89,7.42)
Top Overlay:
  circle w0.25: c10.22,7.42 r0.125
  lines w0.2: -10.31,2.45 -9.21,2.45 -9.21,-5.875 9.21,-5.875 9.21,2.45 10.31,2.45 10.31,5.875 -10.31,5.875 -10.31,2.45
Top Component Center:
  lines w0.05: -0.5,0 0.5,0 ; 0,-0.5 0,0.5
Top Component Outline:
  lines w0.1: -10.16,2.45 -9.21,2.45 -9.21,-5.75 9.21,-5.75 9.21,2.45 10.16,2.45 10.16,5.75 -10.16,5.75 -10.16,2.45
Top Courtyard (Mech26):
  lines w0.05: -10.51,-6.075 -10.51,8.37 10.51,8.37 10.51,-6.075 -10.51,-6.075
Top Designator:
  text ".Designator" at -7.498,-0.5 h1.5
3D body "61900819521.stp": height 5.83, standoff -3.37, extent -10.16,-5.75 10.16,7.77